# Altium footprint library TC_otii_stlink.PcbLib: 16 footprints
Each footprint in its own frame and in the unit in brackets; x right, y up, seen from the top. Pads: shape width x height; smd on the part's side, far side on the other; paste and mask are expansions set on the pad; w line width, h text height; cw(c..) or ccw(c..) is an arc to the next point about the centre after c.
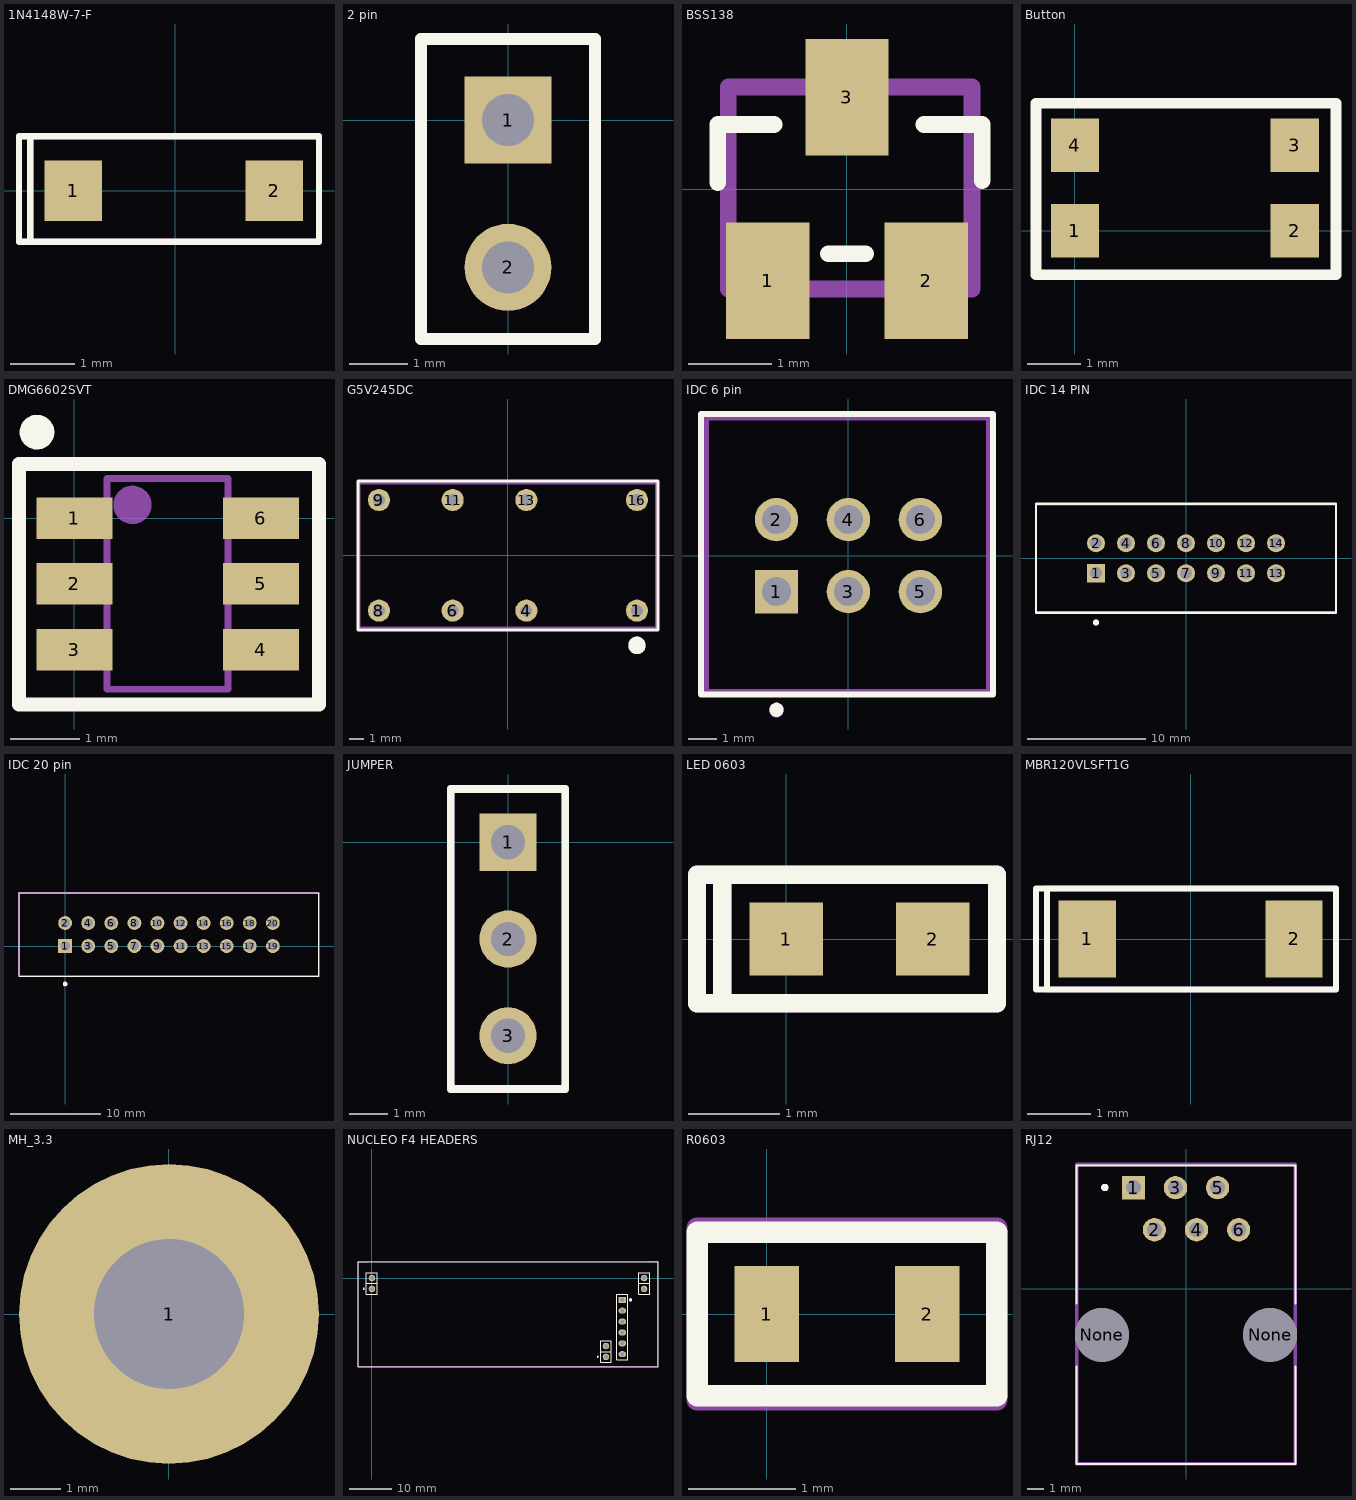
[diagram p0: the footprints below, top view; thin cyan lines are the x and y axes]

## 1N4148W-7-F [mm]
pads (2):
  rect 0.9x0.95 smd: 1(-1.6,0) 2(1.55,0)
Top Overlay:
  lines w0.1: -2.275,-0.8 -2.45,-0.8 -2.45,0.85 -2.275,0.85 ; -2.275,-0.8 2.25,-0.8 2.25,0.85 -2.275,0.85 ; -2.275,-0.8 -2.275,0.85
Mechanical 29:
  lines w0.1: -2.275,-0.775 -2.275,0.85 ; -2.45,-0.8 2.25,-0.8 2.25,0.85 -2.45,0.85 -2.45,-0.8
  text "'.Designator'" at -1.075,-0.25 h0.6
3D body "CircuitWorks-SOD123.step": height 1.27, standoff 0, extent -1.825,-0.8 1.875,0.8

## 2 pin [mm]
pads (2):
  rect 1.5x1.5 hole 0.9: 1(0,0)
  round 1.5 hole 0.9: 2(0,-2.54)
Top Overlay:
  lines w0.2: -1.5,-3.775 1.5,-3.775 1.5,1.397 -1.5,1.397 -1.5,-3.775
Mechanical 1:
  lines w0.2: -1.5,-3.775 -1.5,1.397 1.5,1.397 1.5,-3.775 -1.5,-3.775
  text "'.Designator'" at -0.5,0.85 h1.3
3D body "User Library-Pin Header Strip.step": height 8.51, standoff -3.68, extent -1.42,-3.775 1.5,1.305

## BSS138 [mm]
pads (3):
  rect 1x1.4 smd: 1(-0.95,-1.1) 2(0.95,-1.1) 3(0,1.1)
Top Overlay:
  lines w0.2: -1.55,0.075 -1.55,0.775 -0.875,0.775 ; -0.225,-0.775 0.225,-0.775 ; 0.925,0.775 1.625,0.775 1.625,0.1
Mechanical 29:
  lines w0.2: -1.425,-1.2 1.5,-1.2 1.5,1.225 -1.425,1.225 -1.425,-1.2
  text "'.Designator'" at -1.05,-0.375 h0.8
3D body "Trans_Diodes_DMG3415U-7_eec.STEP": height 1.02, standoff -0.01, extent -1.425,-1.212 1.475,1.218

## Button [mm]
pads (4):
  rect 0.9x1 smd: 1(0,0) 2(4.1,0) 3(4.1,1.6) 4(0,1.6)
Top Overlay:
  lines w0.2: -0.728,-0.82 -0.728,2.38 4.872,2.38 4.872,-0.82 -0.728,-0.82
Mechanical 29:
  lines w0.1: -0.728,-0.82 -0.728,2.38 4.872,2.38 4.872,-0.82 -0.728,-0.82
  text "'.Designator'" at 0.794,0.34 h0.8
3D body "User Library-Switch-CK-KMR2.STEP": height 2.1, standoff 0, extent -0.248,-0.71 4.352,2.29

## DMG6602SVT [mm]
pads (6):
  rect 1.1x0.6 smd: 1(0,0) 2(0,-0.95) 3(0,-1.9) 4(2.7,-1.9) 5(2.7,-0.95) 6(2.7,0)
Top Overlay:
  circle w0.25: c-0.54,1.245 r0.125
  lines w0.2: -0.8,-2.695 3.54,-2.695 3.54,0.785 -0.8,0.785 -0.8,-2.695
Mechanical 29:
  circle w0.3: c0.842,0.193 r0.127
  lines w0.1: 0.475,-2.475 0.475,0.575 2.225,0.575 2.225,-2.475 0.475,-2.475
  text ".Designator" at 1.858,-2.093 h0.8
3D body "TSOT26.step": height 1, standoff 0, extent -0.15,-2.5 2.85,0.6

## G5V245DC [mil]
pads (8):
  round 60 hole 31.5: 1(350,-150) 4(50,-150) 6(-150,-150) 8(-350,-150) 9(-350,150) 11(-150,150) 13(50,150) 16(350,150)
Top Overlay:
  circle w39.37: c350,-244.49 r3.94
  lines w7.87: -406.89,-202.17 407.09,-202.17 407.09,201.38 -406.89,201.38 -406.89,-202.17
Mechanical 1:
  circle w39.37: c350,-244.49 r3.94
  lines w7.87: -403.94,-197.24 -403.94,196.46 403.15,196.46 403.15,-197.24 -403.94,-197.24
  text "'.Designator'" at -300.2,-27.56 h51.18
3D body: height 452.76, standoff 0, extent -403.94,-197.24 403.15,196.46
3D body: height 452.76, standoff 0, extent -403.94,-197.24 403.15,196.46

## IDC 6 pin [mm]
pads (6):
  rect 1.53x1.53 hole 1.02: 1(-2.54,-1.27)
  round 1.53 hole 1.02: 2(-2.54,1.27) 3(0,-1.27) 4(0,1.27) 5(2.54,-1.27) 6(2.54,1.27)
Top Overlay:
  circle w0.3: c-2.54,-5.439 r0.1
  lines w0.2: -5.2,-4.9 5.1,-4.9 5.1,5 -5.2,5 -5.2,-4.9
Mechanical 1:
  circle w0.254: c-2.54,-5.461 r0.127
  lines w0.2: -5.025,-4.8 4.95,-4.8 4.95,4.875 -5.025,4.875 -5.025,-4.8
  text "'.Designator'" at -2.54,-1.27 h1.3
Mechanical 4:
  circle w0.3: c-2.54,-5.439 r0.1
  circle w0.3: c-2.54,-5.439 r0.1
3D body "901301206.stp": height 10.95, standoff -2.85, extent -5.025,-4.875 4.935,4.875

## IDC 14 PIN [mm]
pads (14):
  rect 1.53x1.53 hole 1.02: 1(-7.62,-1.27)
  round 1.53 hole 1.02: 2(-7.62,1.27) 3(-5.08,-1.27) 4(-5.08,1.27) 5(-2.54,-1.27) 6(-2.54,1.27) 7(0,-1.27) 8(0,1.27) 9(2.54,-1.27) 10(2.54,1.27) 11(5.08,-1.27) 12(5.08,1.27) 13(7.62,-1.27) 14(7.62,1.27)
Top Overlay:
  circle w0.3: c-7.62,-5.439 r0.1
  lines w0.2: -12.7,-4.61 -12.7,4.61 12.7,4.61 12.7,-4.61 -12.7,-4.61
Mechanical 1:
  circle w0.254: c-7.62,-5.461 r0.127
  lines w0.2: -12.7,-4.572 -12.7,4.572 12.7,4.572 12.7,-4.572 -12.7,-4.572
  text "'.Designator'" at -7.825,-1.25 h1.3
Mechanical 4:
  circle w0.3: c-7.62,-5.439 r0.1
  circle w0.3: c-7.62,-5.439 r0.1
3D body "702461404.stp": height 9.36, standoff -3.34, extent -12.7,-4.445 12.7,4.445

## IDC 20 pin [mm]
pads (20):
  rect 1.53x1.53 hole 1.02: 1(0,0)
  round 1.53 hole 1.02: 2(0,2.54) 3(2.54,0) 4(2.54,2.54) 5(5.08,0) 6(5.08,2.54) 7(7.62,0) 8(7.62,2.54) 9(10.16,0) 10(10.16,2.54) 11(12.7,0) 12(12.7,2.54) 13(15.24,0) 14(15.24,2.54) 15(17.78,0) 16(17.78,2.54) 17(20.32,0) 18(20.32,2.54) 19(22.86,0) 20(22.86,2.54)
Top Overlay:
  circle w0.3: c0,-4.169 r0.1
  lines w0.127: -5.08,-3.34 -5.08,5.88 27.94,5.88 27.94,-3.34 -5.08,-3.34
Mechanical 1:
  circle w0.254: c0,-4.191 r0.127
  lines w0.2: -5.08,-3.302 -5.08,5.842 27.94,5.842 27.94,-3.302 -5.08,-3.302
  text "'.Designator'" at 0,0 h1.3
Mechanical 4:
  circle w0.3: c0,-4.169 r0.1
  circle w0.3: c0,-4.169 r0.1
  lines w0.127: -5.08,-3.34 -5.08,5.88 ; -5.08,-3.34 27.94,-3.34 ; -5.08,-3.34 -5.08,5.88 ; -5.08,-3.34 27.94,-3.34 ; -5.08,5.88 27.94,5.88 ; -5.08,5.88 27.94,5.88 ; 27.94,-3.34 27.94,5.88 ; 27.94,-3.34 27.94,5.88
3D body "c-1761681-7-a-3d.stp": height 9.1, standoff -3.02, extent -5.08,-3.302 27.94,5.918

## JUMPER [mm]
pads (3):
  rect 1.5x1.5 hole 0.9: 1(0,0)
  round 1.5 hole 0.9: 2(0,-2.54) 3(0,-5.08)
Top Overlay:
  lines w0.2: -1.5,-6.477 -1.5,1.397 1.5,1.397 1.5,-6.477 -1.5,-6.477
Mechanical 1:
  lines w0.2: -1.5,-6.477 1.5,-6.477 1.5,1.397 -1.5,1.397 -1.5,-6.477
  text "'.Designator'" at -0.508,0.254 h1.3
3D body "User Library-PinHeaderX3.STEP": height 8.51, standoff -3.68, extent -1.42,-6.35 1.5,1.27

## LED 0603 [mm]
pads (2):
  rect 0.8x0.8 smd: 1(0,0) 2(1.6,0)
Top Overlay:
  lines w0.2: -0.7,-0.7 2.3,-0.7 2.3,0.7 -0.7,0.7 ; -0.7,-0.7 -0.7,0.7 ; -0.7,-0.7 -0.975,-0.7 -0.975,0.7 -0.7,0.7
Mechanical 29:
  lines w0.2: -0.7,-0.7 -0.7,0.7 ; -0.975,-0.7 2.3,-0.7 2.3,0.7 -0.975,0.7 -0.975,-0.7
  text "'.Designator'" at -0.4,-0.1 h0.6
3D body: height 0.61, standoff 0, extent 0.451,-0.2 1.251,0.2
3D body: height 0.65, standoff 0, extent 0.8,0.2 0.8,0.2
3D body "User Library-LED SMD 0603 super red.step": height 0.6, standoff -0.05, extent -0.1,-0.4 1.6,0.4

## MBR120VLSFT1G [mm]
pads (2):
  rect 0.91x1.22 smd: 1(-1.635,0) 2(1.635,0)
Top Overlay:
  lines w0.1: -2.25,0.8 -2.45,0.8 -2.45,-0.8 -2.275,-0.8 ; -2.275,-0.8 2.3,-0.8 2.3,0.8 -2.275,0.8 -2.275,-0.8
Mechanical 29:
  circle w0.254: c-1.65,0 r0.125
  lines w0.1: -2.275,-0.8 2.3,-0.8 2.3,0.8 -2.275,0.8 -2.275,-0.8
  text "'.Designator'" at -1.075,-0.225 h0.6
3D body "User Library-SOD323.step": height 0.9, standoff -0.09, extent -1.25,-0.65 1.25,0.6
3D body: height 1, standoff 0, extent -1.35,-0.825 1.35,0.825

## MH_3.3 [mm]
pads (1):
  round 6 hole 3 unplated: 1(0,0)

## NUCLEO F4 HEADERS [mil]
pads (12):
  round 60 hole 40: 1(0,0) 2(0,-100) 3(2150,-625) 4(2150,-725) 11(2500,0) 12(2500,-100)
  rect 70x55 hole 40: 5(2300,-200)
  oval 70x55 hole 40: 6(2300,-300) 7(2300,-400) 8(2300,-500) 9(2300,-600) 10(2300,-700)
Top Overlay:
  circle w10: c2075,-724.92 r5.08
  circle w15: c2375,-200.08 r7.5
  circle w10: c-75,-99.92 r5.08
  lines w6: -50.04,-49.96 49.96,-49.96 ; 2099.96,-674.96 2199.96,-674.96 ; 2449.96,-49.96 2549.96,-49.96 ; -50.04,-149.96 -50.04,50.04 49.96,50.04 49.96,-149.96 -50.04,-149.96 ; 2099.96,-774.96 2199.96,-774.96 2199.96,-574.96 2099.96,-574.96 2099.96,-774.96 ; 2449.96,-149.96 2549.96,-149.96 2549.96,50.04 2449.96,50.04 2449.96,-149.96
  lines w7.87: -127.95,-812.6 -127.95,151.97 2627.95,151.97 2627.95,-812.6 -127.95,-812.6 ; 2250,-750 2250,-150 2350,-150 2350,-750 2250,-750
Mechanical 1:
  lines w7.87: -127.95,-812.6 -127.95,73.23 -127.95,151.97 -49.21,151.97 2549.21,151.97 2627.95,151.97 2627.95,73.23 2627.95,-812.6 1998.03,-812.6 482.28,-812.6 -127.95,-812.6
  text "'.Designator'" at 2485.24,25.59 h51.18
  text "'.Designator'" at 2283.46,-183.07 h51.18
  text "'.Designator'" at 2126.97,-610.24 h51.18
  text "'.Designator'" at -20.67,-2.95 h51.18
3D body "NUCLEO-F411RE - cut.STEP": height 403.74, standoff -26.26, extent -125.98,-819.19 2629.92,203.05

## R0603 [mm]
pads (2):
  rect 0.6x0.9 smd: 1(0,0) 2(1.5,0)
Top Overlay:
  lines w0.2: -0.647,-0.762 2.147,-0.762 2.147,0.762 -0.647,0.762 -0.647,-0.762
Mechanical 29:
  lines w0.2: -0.65,-0.8 2.15,-0.8 2.15,0.8 -0.65,0.8 -0.65,-0.8
  text "'.Designator'" at -0.05,-0.432 h0.6
3D body "R0603.step": height 0.7, standoff -0.1, extent -0.05,-0.432 1.55,0.408

## RJ12 [mm]
pads (8):
  rect 1.408x1.408 hole 0.9: 1(-3.175,6.096)
  round 1.408 hole 0.9: 2(-1.905,3.556) 3(-0.635,6.096) 4(0.635,3.556) 5(1.905,6.096) 6(3.175,3.556)
  round 3.25 hole 3.25 unplated: None(-5.08,-2.794) None(5.08,-2.794)
Top Overlay:
  circle w0.25: c-4.9,6.106 r0.1
  lines w0.127: -6.605,-4.694 -6.605,-10.594 6.605,-10.594 6.605,-4.694 ; -6.605,-0.894 -6.605,7.426 6.605,7.426 6.605,-0.894
Mechanical 1:
  lines w0.2: -6.606,-10.574 -6.606,7.526 6.604,7.526 6.604,-10.574 -6.606,-10.574
  text "'.Designator'" at -0.508,5.715 h1.3
3D body "955012661.stp": height 11.75, standoff -3.05, extent -6.606,-10.574 6.604,7.526